# Altium footprint library My Library.PCBLIB: 198 footprints (part 5 of 13)
Each footprint in its own frame and in the unit in brackets; x right, y up, seen from the top. Pads: shape width x height; smd on the part's side, far side on the other; paste and mask are expansions set on the pad; w line width, h text height; cw(c..) or ccw(c..) is an arc to the next point about the centre after c.
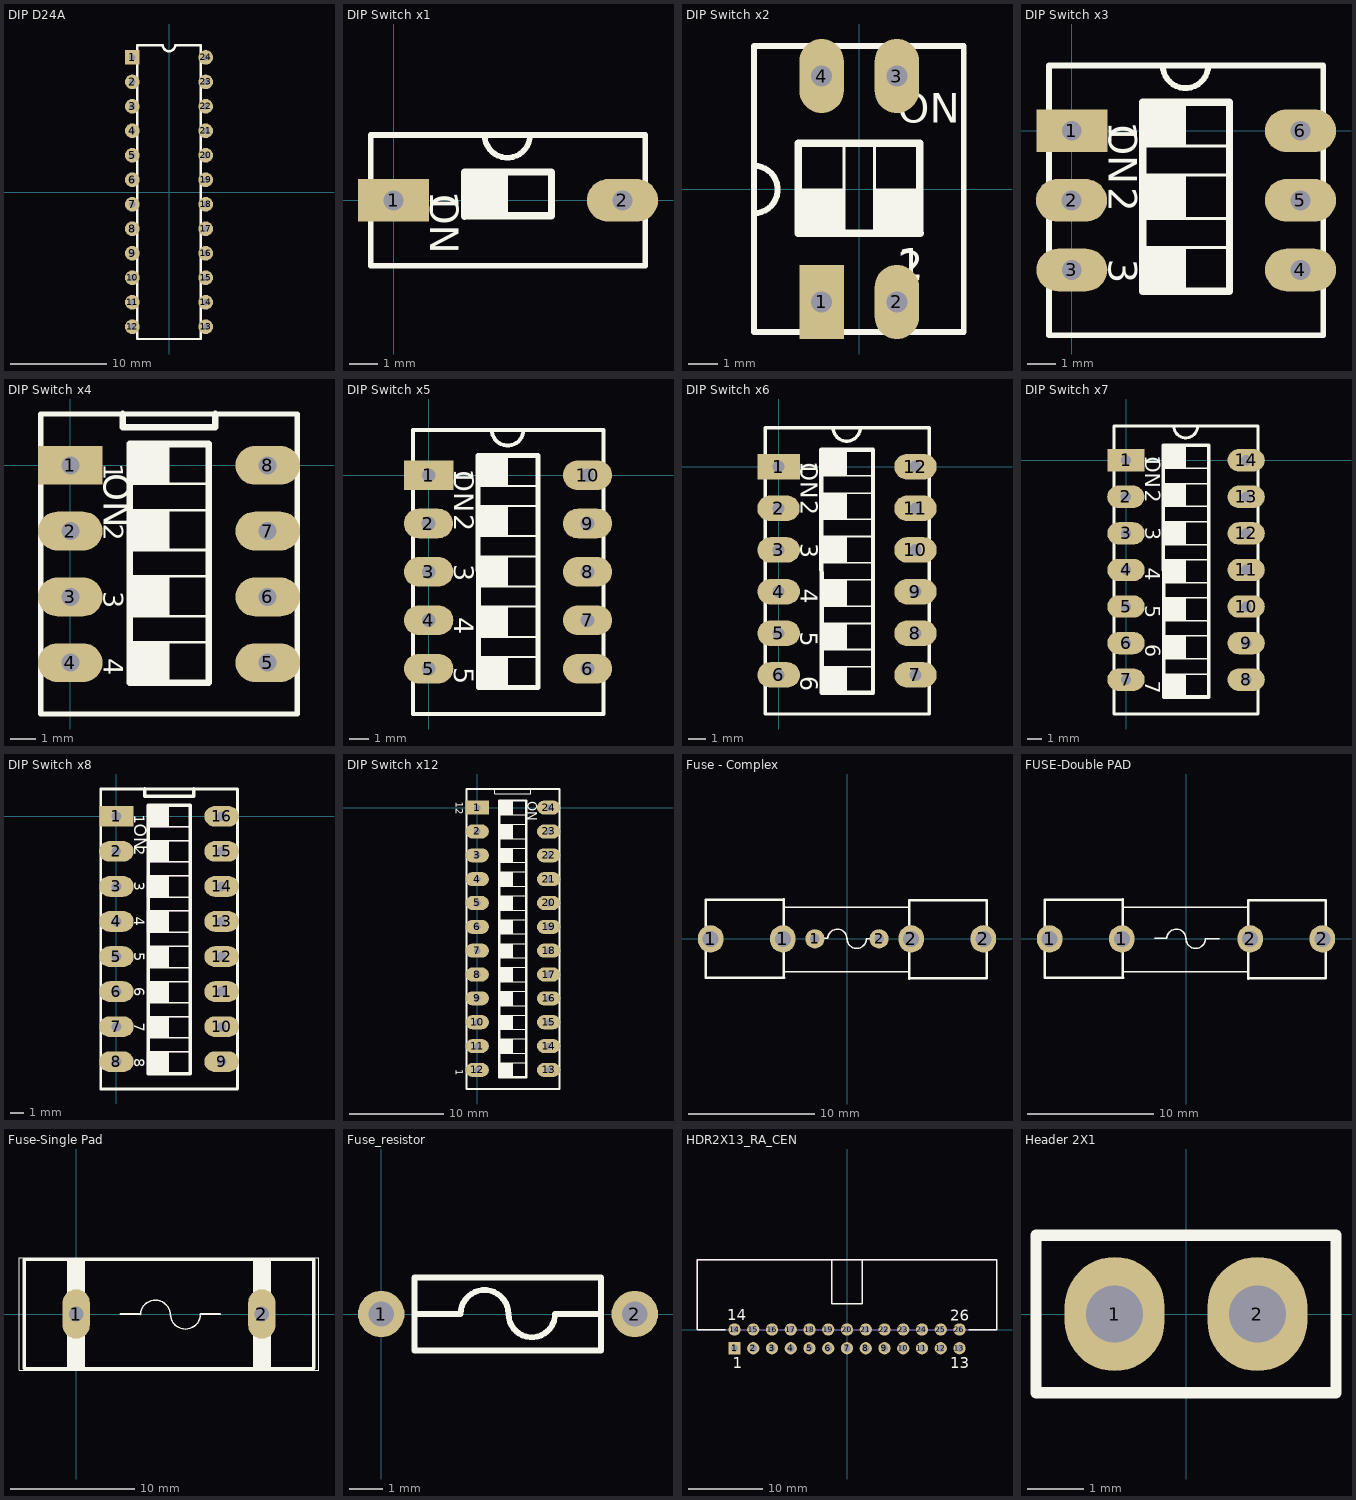
[diagram p4: the footprints below, top view; thin cyan lines are the x and y axes]

## DIP D24A [mil]
pads (24):
  rect 60x60 hole 25: 1(-150,550)
  round 60 hole 25: 2(-150,450) 3(-150,350) 4(-150,250) 5(-150,150) 6(-150,50) 7(-150,-50) 8(-150,-150) 9(-150,-250) 10(-150,-350) 11(-150,-450) 12(-150,-550) 13(150,-550) 14(150,-450) 15(150,-350) 16(150,-250) 17(150,-150) 18(150,-50) 19(150,50) 20(150,150) 21(150,250) 22(150,350) 23(150,450) 24(150,550)
Top Overlay:
  lines w10: -130,-600 130,-600 130,600 25,600 cw(c0,600) -25,600 -130,600 -130,-600
Mechanical 1:
  drawing of 288 lines, arcs and shapes, not listed
3D body: height 75, standoff 65, extent -145,525 -135,575
3D body: height 0, standoff 0, extent -155,525 -155,575
3D body: height 75, standoff 35, extent -155,525 -145,575
3D body: height 35, standoff -75, extent -155,541 -145,559
3D body: height 100, standoff 30, extent -135,-605 135,605
3D body: height 115, standoff 100, extent -135,-605 135,605
3D body: height 35, standoff -75, extent -155,441 -145,459
3D body: height 75, standoff 35, extent -155,425 -145,475
3D body: height 75, standoff 65, extent -145,425 -135,475
3D body: height 35, standoff -75, extent -155,341 -145,359
3D body: height 75, standoff 35, extent -155,325 -145,375
3D body: height 75, standoff 65, extent -145,325 -135,375
3D body: height 35, standoff -75, extent -155,241 -145,259
3D body: height 75, standoff 35, extent -155,225 -145,275
3D body: height 75, standoff 65, extent -145,225 -135,275
3D body: height 35, standoff -75, extent -155,141 -145,159
3D body: height 75, standoff 35, extent -155,125 -145,175
3D body: height 75, standoff 65, extent -145,125 -135,175
3D body: height 35, standoff -75, extent -155,41 -145,59
3D body: height 75, standoff 35, extent -155,25 -145,75
3D body: height 75, standoff 65, extent -145,25 -135,75
3D body: height 35, standoff -75, extent -155,-59 -145,-41
3D body: height 75, standoff 35, extent -155,-75 -145,-25
3D body: height 75, standoff 65, extent -145,-75 -135,-25
3D body: height 35, standoff -75, extent -155,-159 -145,-141
3D body: height 75, standoff 35, extent -155,-175 -145,-125
3D body: height 75, standoff 65, extent -145,-175 -135,-125
3D body: height 35, standoff -75, extent -155,-259 -145,-241
3D body: height 75, standoff 35, extent -155,-275 -145,-225
3D body: height 75, standoff 65, extent -145,-275 -135,-225
3D body: height 35, standoff -75, extent -155,-359 -145,-341
3D body: height 75, standoff 35, extent -155,-375 -145,-325
3D body: height 75, standoff 65, extent -145,-375 -135,-325
3D body: height 35, standoff -75, extent -155,-459 -145,-441
3D body: height 75, standoff 35, extent -155,-475 -145,-425
3D body: height 75, standoff 65, extent -145,-475 -135,-425
3D body: height 35, standoff -75, extent -155,-559 -145,-541
3D body: height 75, standoff 35, extent -155,-575 -145,-525
3D body: height 75, standoff 65, extent -145,-575 -135,-525
3D body: height 35, standoff -75, extent 145,-559 155,-541
3D body: height 75, standoff 35, extent 145,-575 155,-525
3D body: height 75, standoff 65, extent 135,-575 145,-525
3D body: height 35, standoff -75, extent 145,-459 155,-441
3D body: height 75, standoff 35, extent 145,-475 155,-425
3D body: height 75, standoff 65, extent 135,-475 145,-425
3D body: height 35, standoff -75, extent 145,-359 155,-341
3D body: height 75, standoff 35, extent 145,-375 155,-325
3D body: height 75, standoff 65, extent 135,-375 145,-325
3D body: height 35, standoff -75, extent 145,-259 155,-241
3D body: height 75, standoff 35, extent 145,-275 155,-225
3D body: height 75, standoff 65, extent 135,-275 145,-225
3D body: height 35, standoff -75, extent 145,-159 155,-141
3D body: height 75, standoff 35, extent 145,-175 155,-125
3D body: height 75, standoff 65, extent 135,-175 145,-125
3D body: height 35, standoff -75, extent 145,-59 155,-41
3D body: height 75, standoff 35, extent 145,-75 155,-25
3D body: height 75, standoff 65, extent 135,-75 145,-25
3D body: height 35, standoff -75, extent 145,41 155,59
3D body: height 75, standoff 35, extent 145,25 155,75
3D body: height 75, standoff 65, extent 135,25 145,75
3D body: height 35, standoff -75, extent 145,141 155,159
3D body: height 75, standoff 35, extent 145,125 155,175
3D body: height 75, standoff 65, extent 135,125 145,175
3D body: height 35, standoff -75, extent 145,241 155,259
3D body: height 75, standoff 35, extent 145,225 155,275
3D body: height 75, standoff 65, extent 135,225 145,275
3D body: height 35, standoff -75, extent 145,341 155,359
3D body: height 75, standoff 35, extent 145,325 155,375
3D body: height 75, standoff 65, extent 135,325 145,375
3D body: height 35, standoff -75, extent 145,441 155,459
3D body: height 75, standoff 35, extent 145,425 155,475
3D body: height 75, standoff 65, extent 135,425 145,475
3D body: height 35, standoff -75, extent 145,541 155,559
3D body: height 75, standoff 35, extent 145,525 155,575
3D body: height 75, standoff 65, extent 135,525 145,575

## DIP Switch x1 [mm]
height 6.5
pads (2):
  rect 2.5x1.5 hole 0.7: 1(0,0)
  oval 2.5x1.5 hole 0.7: 2(8.05,0)
Top Overlay:
  rectangle: 2.5,-0.556 4.025,1
  lines w0.2: 3.202,2.3 ccw(c4.002,2.3) 4.802,2.3 ; -0.8,-2.3 8.85,-2.3 8.85,2.3 -0.8,2.3 -0.8,-2.3
  lines w0.25: 2.53,-0.54 5.55,-0.54
  lines w0.254: 2.5,-0.556 2.5,1 5.55,1 5.55,-0.54
  text "1" at 1.295,0.33 h1
  text "ON" at 1.295,0.22 h1

## DIP Switch x2 [mm]
height 6.5
pads (4):
  rect 1.5x2.5 hole 0.7: 1(-1.27,-3.81)
  oval 1.5x2.5 hole 0.7: 2(1.27,-3.81) 3(1.27,3.81) 4(-1.27,3.81)
Top Overlay:
  region: 2.056,-1.5 2.056,0.025 0.5,0.025 0.5,-1.5
  region: -0.494,-1.5 -0.494,0.025 -2.05,0.025 -2.05,-1.5
  lines w0.1: -0.51,-1.47 -0.51,1.55 ; 0.51,-1.47 0.51,1.55
  lines w0.2: -3.55,-0.818 ccw(c-3.55,-0.018) -3.55,0.783 ; 3.5,-4.82 -3.55,-4.82 -3.55,4.83 3.5,4.83 ; 3.525,-4.82 3.525,4.83
  lines w0.25: 2.04,-1.47 2.04,1.55
  lines w0.254: 2.04,1.55 -2.05,1.55 -2.05,-1.5 2.056,-1.5
  text "2" at 1.295,-3.08 h1
  text "1" at 1.295,-3 h1
  text "ON" at 1.295,2.23 h1
3D body "dip2.STEP": height 6.91, standoff -1.79, extent -3.25,-5.03 3.25,4.97

## DIP Switch x3 [mm]
height 6.5
pads (6):
  rect 2.5x1.5 hole 0.7: 1(0,0)
  oval 2.5x1.5 hole 0.7: 2(-0.01,-2.45) 3(0,-4.9) 4(8.05,-4.9) 5(8.05,-2.45) 6(8.05,0)
Top Overlay:
  rectangle: 2.5,-0.556 4.025,1
  rectangle: 2.5,-3.106 4.025,-1.55
  rectangle: 2.5,-5.662 4.025,-4.106
  lines w0.1: 2.53,-4.11 5.55,-4.11 ; 2.53,-3.09 5.55,-3.09 ; 2.53,-1.56 5.55,-1.56 ; 2.53,-0.54 5.55,-0.54
  lines w0.2: 3.202,2.3 ccw(c4.002,2.3) 4.802,2.3 ; -0.8,-7.2 -0.8,2.3 8.85,2.3 8.85,-7.2 -0.8,-7.2
  lines w0.25: 2.53,-5.65 5.55,-5.65
  lines w0.254: 2.5,-5.662 2.5,1 5.55,1 5.55,-5.65
  text "ON" at 1.295,0.22 h1
  text "1" at 1.295,0.33 h1
  text "2" at 1.295,-1.98 h1
  text "3" at 1.295,-4.5 h1

## DIP Switch x4 [mm]
height 6.5
pads (8):
  rect 2.5x1.5 hole 0.7: 1(0,0)
  oval 2.5x1.5 hole 0.7: 2(0,-2.54) 3(0,-5.08) 4(0,-7.62) 5(7.62,-7.62) 6(7.62,-5.08) 7(7.62,-2.54) 8(7.62,0)
Top Overlay:
  rectangle: 2.297,-8.394 3.822,-6.838
  rectangle: 2.297,-5.84 3.822,-4.284
  rectangle: 2.297,-3.284 3.822,-1.728
  rectangle: 2.297,-0.734 3.822,0.822
  lines w0.1: 2.327,-6.828 5.347,-6.828 ; 2.327,-5.828 5.347,-5.828 ; 2.327,-4.288 5.347,-4.288 ; 2.327,-3.268 5.347,-3.268 ; 2.327,-1.738 5.347,-1.738 ; 2.327,-0.718 5.347,-0.718
  lines w0.2: -1.143,-9.601 8.763,-9.601 8.763,1.981 -1.143,1.981 -1.143,-9.601
  lines w0.25: 2.297,-8.394 5.347,-8.388
  lines w0.254: 2.032,1.981 2.032,1.473 5.588,1.473 5.588,1.981 ; 2.297,-8.394 2.297,0.822 5.347,0.822 5.347,-8.388
  text "4" at 1.295,-7.444 h0.76
  text "3" at 1.295,-4.853 h0.76
  text "2" at 1.295,-2.261 h0.76
  text "1" at 1.295,0.076 h0.76
  text "ON" at 1.295,-0.313 h1
Mechanical 1:
  circle w0.025: c0,0 r0.254
  circle w0.025: c-0.01,-2.54 r0.254
  circle w0.025: c0,-5.08 r0.254
  circle w0.025: c0,-7.62 r0.254
  circle w0.025: c7.62,-7.62 r0.254
  circle w0.025: c7.62,-5.08 r0.254
  circle w0.025: c7.62,-2.54 r0.254
  circle w0.025: c7.62,0 r0.254
3D body: height 6.35, standoff 0.25, extent 2.362,-0.762 3.073,0.762
3D body: height 0.76, standoff 0, extent 7.367,-0.253 7.873,0.253
3D body: height 0.76, standoff 0, extent 7.367,-2.793 7.873,-2.287
3D body: height 0.76, standoff 0, extent 7.367,-5.333 7.873,-4.827
3D body: height 0.76, standoff 0, extent 7.367,-7.873 7.873,-7.367
3D body: height 0.76, standoff 0, extent -0.253,-0.253 0.253,0.253
3D body: height 0.76, standoff 0, extent -0.263,-2.793 0.243,-2.287
3D body: height 0.76, standoff 0, extent -0.253,-5.333 0.253,-4.827
3D body: height 0.76, standoff 0, extent -0.253,-7.873 0.253,-7.367
3D body: height 3.81, standoff 0, extent 1.9,1.473 5.71,1.981
3D body: height 5.59, standoff 0, extent -1.143,-9.652 8.763,1.981
3D body: height 0.25, standoff 0.05, extent -1.143,-9.652 8.763,1.981
3D body: height 5.08, standoff 0.25, extent 3.073,-0.762 5.253,0.762
3D body: height 5.08, standoff 0.25, extent 3.073,-5.842 5.253,-4.318
3D body: height 6.35, standoff 0.25, extent 2.362,-5.842 3.073,-4.318
3D body: height 5.08, standoff 0.25, extent 3.073,-8.382 5.253,-6.858
3D body: height 6.35, standoff 0.25, extent 2.362,-8.382 3.073,-6.858
3D body: height 5.59, standoff 0, extent 2.362,0.762 5.253,1.473
3D body: height 5.59, standoff 0, extent 2.362,-1.778 5.253,-0.762
3D body: height 5.59, standoff 0, extent 2.362,-6.858 5.253,-5.842
3D body: height 5.59, standoff 0, extent 2.362,-4.318 5.253,-3.302
3D body: height 5.08, standoff 0.25, extent 3.073,-3.302 5.253,-1.778
3D body: height 6.35, standoff 0.25, extent 2.362,-3.302 3.073,-1.778
3D body: height 5.59, standoff 0.25, extent 5.975,-0.597 7.55,1.021
3D body: height 5.59, standoff 0.03, extent 6.06,-0.189 7.478,0.618
3D body: height 5.59, standoff 0.25, extent 5.986,-2.3 7.537,-0.734

## DIP Switch x5 [mm]
height 6.5
pads (10):
  rect 2.5x1.5 hole 0.7: 1(0,0)
  oval 2.5x1.5 hole 0.7: 2(-0.01,-2.45) 3(0,-4.9) 4(0,-7.35) 5(0,-9.8) 6(8.05,-9.8) 7(8.05,-7.35) 8(8.05,-4.9) 9(8.05,-2.45) 10(8.05,0)
Top Overlay:
  rectangle: 2.5,-10.766 4.025,-9.21
  rectangle: 2.5,-8.216 4.025,-6.66
  rectangle: 2.5,-5.662 4.025,-4.106
  rectangle: 2.5,-3.106 4.025,-1.55
  rectangle: 2.5,-0.556 4.025,1
  lines w0.1: 2.53,-9.22 5.55,-9.22 ; 2.53,-8.21 5.55,-8.21 ; 2.53,-6.65 5.55,-6.65 ; 2.53,-5.65 5.55,-5.65 ; 2.53,-4.11 5.55,-4.11 ; 2.53,-3.09 5.55,-3.09 ; 2.53,-1.56 5.55,-1.56 ; 2.53,-0.54 5.55,-0.54
  lines w0.2: 3.202,2.3 ccw(c4.002,2.3) 4.802,2.3 ; -0.8,-12.1 8.85,-12.1 8.85,2.3 -0.8,2.3 -0.8,-12.1
  lines w0.25: 2.53,-10.76 5.55,-10.76
  lines w0.254: 2.53,-10.76 2.5,1 5.55,1 5.55,-10.76
  text "5" at 1.295,-9.72 h1
  text "4" at 1.295,-7.19 h1
  text "3" at 1.295,-4.5 h1
  text "2" at 1.295,-1.98 h1
  text "1" at 1.295,0.33 h1
  text "ON" at 1.295,0.22 h1

## DIP Switch x6 [mm]
height 6.5
pads (12):
  rect 2.5x1.5 hole 0.7: 1(0,0)
  oval 2.5x1.5 hole 0.7: 2(-0.01,-2.45) 3(0,-4.9) 4(0,-7.35) 5(0,-9.8) 6(0,-12.25) 7(8.05,-12.25) 8(8.05,-9.8) 9(8.05,-7.35) 10(8.05,-4.9) 11(8.05,-2.45) 12(8.05,0)
Top Overlay:
  rectangle: 2.5,-0.556 4.025,1
  rectangle: 2.5,-3.106 4.025,-1.55
  rectangle: 2.5,-5.662 4.025,-4.106
  rectangle: 2.5,-8.216 4.025,-6.66
  rectangle: 2.5,-10.766 4.025,-9.21
  rectangle: 2.5,-13.316 4.025,-11.76
  lines w0.1: 2.53,-11.77 5.55,-11.77 ; 2.53,-10.76 5.55,-10.76 ; 2.53,-9.22 5.55,-9.22 ; 2.53,-8.21 5.55,-8.21 ; 2.53,-6.65 5.55,-6.65 ; 2.53,-5.65 5.55,-5.65 ; 2.53,-4.11 5.55,-4.11 ; 2.53,-3.09 5.55,-3.09 ; 2.53,-1.56 5.55,-1.56 ; 2.53,-0.54 5.55,-0.54
  lines w0.2: 3.202,2.3 ccw(c4.002,2.3) 4.802,2.3 ; -0.8,-14.55 -0.8,2.3 8.85,2.3 8.85,-14.55 -0.8,-14.55
  lines w0.25: 2.53,-13.3 5.55,-13.3
  lines w0.254: 2.53,-13.3 2.5,1 5.55,1 5.55,-13.3
  text "ON" at 1.295,0.22 h1
  text "1" at 1.295,0.33 h1
  text "2" at 1.295,-1.98 h1
  text "3" at 1.295,-4.5 h1
  text "4" at 1.295,-7.19 h1
  text "5" at 1.295,-9.72 h1
  text "6" at 1.295,-12.34 h1

## DIP Switch x7 [mm]
height 6.5
pads (14):
  rect 2.5x1.5 hole 0.7: 1(0,0)
  oval 2.5x1.5 hole 0.7: 2(-0.01,-2.45) 3(0,-4.9) 4(0,-7.35) 5(0,-9.8) 6(0,-12.25) 7(0,-14.7) 8(8.05,-14.7) 9(8.05,-12.25) 10(8.05,-9.8) 11(8.05,-7.35) 12(8.05,-4.9) 13(8.05,-2.45) 14(8.05,0)
Top Overlay:
  rectangle: 2.5,-15.876 4.025,-14.32
  rectangle: 2.5,-13.316 4.025,-11.76
  rectangle: 2.5,-10.766 4.025,-9.21
  rectangle: 2.5,-8.216 4.025,-6.66
  rectangle: 2.5,-5.662 4.025,-4.106
  rectangle: 2.5,-3.106 4.025,-1.55
  rectangle: 2.5,-0.556 4.025,1
  lines w0.1: 2.53,-14.33 5.55,-14.33 ; 2.53,-13.3 5.55,-13.3 ; 2.53,-11.77 5.55,-11.77 ; 2.53,-10.76 5.55,-10.76 ; 2.53,-9.22 5.55,-9.22 ; 2.53,-8.21 5.55,-8.21 ; 2.53,-6.65 5.55,-6.65 ; 2.53,-5.65 5.55,-5.65 ; 2.53,-4.11 5.55,-4.11 ; 2.53,-3.09 5.55,-3.09 ; 2.53,-1.56 5.55,-1.56 ; 2.53,-0.54 5.55,-0.54
  lines w0.2: 3.202,2.3 ccw(c4.002,2.3) 4.802,2.3 ; -0.8,-17 8.85,-17 8.85,2.3 -0.8,2.3 -0.8,-17
  lines w0.25: 2.53,-15.86 5.55,-15.86
  lines w0.254: 2.53,-15.86 2.5,1 5.55,1 5.55,-15.86
  text "7" at 1.295,-14.77 h1
  text "6" at 1.295,-12.34 h1
  text "5" at 1.295,-9.72 h1
  text "4" at 1.295,-7.19 h1
  text "3" at 1.295,-4.5 h1
  text "2" at 1.295,-1.98 h1
  text "1" at 1.295,0.33 h1
  text "ON" at 1.295,0.22 h1

## DIP Switch x8 [mm]
height 6.5
pads (16):
  rect 2.5x1.5 hole 0.7: 1(0,0)
  oval 2.5x1.5 hole 0.7: 2(-0.01,-2.54) 3(0,-5.08) 4(0,-7.62) 5(0,-10.16) 6(0,-12.7) 7(0,-15.24) 8(0,-17.78) 9(7.62,-17.78) 10(7.62,-15.24) 11(7.62,-12.7) 12(7.62,-10.16) 13(7.62,-7.62) 14(7.62,-5.08) 15(7.62,-2.54) 16(7.62,0)
Top Overlay:
  rectangle: 2.297,-0.759 3.822,0.797
  rectangle: 2.297,-3.309 3.822,-1.753
  rectangle: 2.297,-5.866 3.822,-4.309
  rectangle: 2.297,-8.419 3.822,-6.863
  rectangle: 2.297,-10.969 3.822,-9.413
  rectangle: 2.297,-13.519 3.822,-11.963
  rectangle: 2.297,-16.079 3.822,-14.523
  rectangle: 2.297,-18.629 3.822,-17.073
  lines w0.1: 2.327,-17.073 5.347,-17.073 ; 2.327,-16.063 5.347,-16.063 ; 2.327,-14.533 5.347,-14.533 ; 2.327,-13.503 5.347,-13.503 ; 2.327,-11.973 5.347,-11.973 ; 2.327,-10.963 5.347,-10.963 ; 2.327,-9.423 5.347,-9.423 ; 2.327,-8.413 5.347,-8.413 ; 2.327,-6.853 5.347,-6.853 ; 2.327,-5.853 5.347,-5.853 ; 2.327,-4.313 5.347,-4.313 ; 2.327,-3.293 5.347,-3.293 ; 2.327,-1.763 5.347,-1.763 ; 2.327,-0.743 5.347,-0.743
  lines w0.2: -1.143,-19.761 8.763,-19.761 8.763,1.981 -1.143,1.981 -1.143,-19.761
  lines w0.254: 2.032,1.981 2.032,1.473 5.588,1.473 5.588,1.981 ; 2.297,-18.653 2.297,0.797 5.347,0.797 5.347,-18.653 2.297,-18.653
  text "ON" at 1.295,-0.542 h0.89
  text "1" at 1.295,0.101 h0.76
  text "2" at 1.295,-2.163 h0.76
  text "3" at 1.295,-4.723 h0.76
  text "4" at 1.295,-7.284 h0.76
  text "5" at 1.295,-9.844 h0.76
  text "6" at 1.295,-12.405 h0.76
  text "7" at 1.295,-14.965 h0.76
  text "8" at 1.295,-17.526 h0.76
Mechanical 1:
  circle w0.025: c0,0 r0.254
  circle w0.025: c7.62,0 r0.254
  circle w0.025: c7.62,-2.54 r0.254
  circle w0.025: c-0.01,-2.54 r0.254
  circle w0.025: c0,-5.08 r0.254
  circle w0.025: c7.62,-5.08 r0.254
  circle w0.025: c7.62,-7.62 r0.254
  circle w0.025: c0,-7.62 r0.254
  circle w0.025: c0,-10.16 r0.254
  circle w0.025: c7.62,-10.16 r0.254
  circle w0.025: c7.62,-12.7 r0.254
  circle w0.025: c0,-12.7 r0.254
  circle w0.025: c0,-15.24 r0.254
  circle w0.025: c7.62,-15.24 r0.254
  circle w0.025: c7.62,-17.78 r0.254
  circle w0.025: c0,-17.78 r0.254
  lines w0.025: 5.309,-11.938 5.309,-13.487 2.261,-13.487 2.261,-11.938 5.359,-11.938 ; 5.309,-6.833 5.309,-8.407 2.235,-8.407 2.235,-6.833 5.359,-6.833 ; 5.334,-17.069 5.334,-18.694 2.235,-18.694 2.235,-17.069 5.359,-17.069 ; 5.334,-14.529 2.261,-14.529 2.261,-16.027 5.359,-16.027 5.359,-14.529 ; 5.334,-4.318 5.334,-5.867 2.235,-5.867 2.235,-4.318 5.359,-4.318 ; 5.334,-0.762 5.41,-0.762 5.41,0.813 2.235,0.813 2.235,-0.762 5.359,-0.762 ; 5.359,-9.423 5.359,-10.947 2.261,-10.947 2.261,-9.423 5.385,-9.423 ; -1.143,-19.761 8.763,-19.761 8.763,1.981 -1.143,1.981 -1.143,-19.761 ; 2.032,1.473 5.588,1.473 5.588,1.981 2.032,1.981 2.032,1.473 ; 2.261,-3.302 5.334,-3.302 5.334,-1.778 2.261,-1.778 2.261,-3.302
3D body: height 5.59, standoff 0, extent 2.235,-19.761 5.41,-18.693
3D body: height 5.59, standoff 0, extent 2.236,-17.069 5.411,-16.154
3D body: height 5.59, standoff 0, extent 2.261,-14.529 5.436,-13.487
3D body: height 5.59, standoff 0, extent 2.262,-11.938 5.437,-11.048
3D body: height 5.59, standoff 0, extent 2.236,-9.423 5.411,-8.407
3D body: height 5.59, standoff 0, extent 2.236,-6.832 5.411,-5.866
3D body: height 5.59, standoff 0, extent 2.236,-4.318 5.411,-3.403
3D body: height 5.59, standoff 0, extent 2.235,-1.778 5.41,-0.762
3D body: height 5.59, standoff 0, extent 2.235,0.813 5.41,1.473
3D body: height 5.59, standoff 0, extent 5.41,-19.761 8.763,1.981
3D body: height 5.59, standoff 0, extent -1.143,-19.761 2.236,1.981
3D body: height 3.81, standoff 0, extent 2.032,1.473 5.613,1.981
3D body: height 0.76, standoff 0, extent 7.367,-2.793 7.873,-2.287
3D body: height 0.76, standoff 0, extent 7.367,-5.333 7.873,-4.827
3D body: height 0.76, standoff 0, extent 7.367,-7.873 7.873,-7.367
3D body: height 0.76, standoff 0, extent 7.367,-0.253 7.873,0.253
3D body: height 0.76, standoff 0, extent 7.367,-18.033 7.873,-17.527
3D body: height 0.76, standoff 0, extent 7.367,-12.953 7.873,-12.447
3D body: height 0.76, standoff 0, extent 7.367,-15.493 7.873,-14.987
3D body: height 5.08, standoff 0, extent 2.236,-5.866 5.334,-4.318
3D body: height 0.76, standoff 0, extent -0.253,-0.253 0.253,0.253
3D body: height 0.76, standoff 0, extent -0.263,-2.793 0.243,-2.287
3D body: height 0.76, standoff 0, extent -0.253,-5.333 0.253,-4.827
3D body: height 0.76, standoff 0, extent -0.253,-7.873 0.253,-7.367
3D body: height 5.08, standoff 0, extent 2.339,-8.405 5.411,-6.832
3D body: height 5.08, standoff 0, extent 2.26,-16.028 5.36,-14.528
3D body: height 5.08, standoff 0, extent 2.313,-18.693 5.411,-17.069
3D body: height 0.76, standoff 0, extent -0.253,-10.413 0.253,-9.907
3D body: height 0.76, standoff 0, extent -0.253,-12.953 0.253,-12.447
3D body: height 0.76, standoff 0, extent -0.253,-15.493 0.253,-14.987
3D body: height 0.76, standoff 0, extent -0.253,-18.033 0.253,-17.527
3D body: height 5.08, standoff 0, extent 2.338,-16.153 5.436,-14.529
3D body: height 5.08, standoff 0, extent 2.339,-13.563 5.437,-11.938
3D body: height 5.08, standoff 0, extent 2.262,-11.048 5.359,-9.423
3D body: height 5.08, standoff 0, extent 2.312,-3.403 5.41,-1.778
3D body: height 5.08, standoff 0, extent 2.312,-0.812 5.41,0.813
3D body: height 6.35, standoff 0, extent 2.235,-0.812 3.759,0.813
3D body: height 6.35, standoff 0, extent 2.261,-3.403 3.785,-1.778
3D body: height 6.35, standoff 0, extent 2.236,-5.943 3.76,-4.318
3D body: height 6.35, standoff 0, extent 2.236,-8.457 3.76,-6.833
3D body: height 6.35, standoff 0, extent 2.262,-11.048 3.786,-9.423
3D body: height 6.35, standoff 0, extent 2.261,-13.563 3.785,-11.938
3D body: height 6.35, standoff 0, extent 2.236,-16.154 3.76,-14.529
3D body: height 6.35, standoff 0, extent 2.235,-18.693 3.759,-17.069

## DIP Switch x12 [mm]
pads (24):
  rect 2.5x1.5 hole 0.7: 1(0,0)
  oval 2.5x1.5 hole 0.7: 2(0,-2.54) 3(0,-5.08) 4(0,-7.62) 5(0,-10.16) 6(0,-12.7) 7(0,-15.24) 8(0,-17.78) 9(0,-20.32) 10(0,-22.86) 11(0,-25.4) 12(0,-27.94) 13(7.62,-27.94) 14(7.62,-25.4) 15(7.62,-22.86) 16(7.62,-20.32) 17(7.62,-17.78) 18(7.62,-15.24) 19(7.62,-12.7) 20(7.62,-10.16) 21(7.62,-7.62) 22(7.62,-5.08) 23(7.62,-2.54) 24(7.62,0)
Top Overlay:
  region: 3.808,0.762 2.362,0.762 2.362,-0.762 3.808,-0.762
  region: 3.808,-1.778 2.362,-1.778 2.362,-3.302 3.808,-3.302
  region: 3.808,-4.318 2.362,-4.318 2.362,-5.842 3.808,-5.842
  region: 3.808,-6.858 2.362,-6.858 2.362,-8.382 3.808,-8.382
  region: 3.808,-9.398 2.362,-9.398 2.362,-10.922 3.808,-10.922
  region: 3.808,-11.938 2.362,-11.938 2.362,-13.462 3.808,-13.462
  region: 3.808,-14.478 2.362,-14.478 2.362,-16.002 3.808,-16.002
  region: 3.808,-17.018 2.362,-17.018 2.362,-18.542 3.808,-18.542
  region: 3.808,-19.558 2.362,-19.558 2.362,-21.082 3.808,-21.082
  region: 3.808,-22.098 2.362,-22.098 2.362,-23.622 3.808,-23.622
  region: 3.808,-24.638 2.362,-24.638 2.362,-26.162 3.808,-26.162
  region: 3.808,-27.178 2.362,-27.178 2.362,-28.702 3.808,-28.702
  lines w0.1: 2.362,-28.702 5.253,-28.702 ; 2.362,-27.178 5.253,-27.178 ; 2.362,-26.162 5.253,-26.162 ; 2.362,-24.638 5.253,-24.638 ; 2.362,-23.622 5.253,-23.622 ; 2.362,-22.098 5.253,-22.098 ; 2.362,-21.082 5.253,-21.082 ; 2.362,-19.558 5.253,-19.558 ; 2.362,-18.542 5.253,-18.542 ; 2.362,-17.018 5.253,-17.018 ; 2.362,-16.002 5.253,-16.002 ; 2.362,-14.478 5.253,-14.478 ; 2.362,-13.462 5.253,-13.462 ; 2.362,-11.938 5.253,-11.938 ; 2.362,-10.922 5.253,-10.922 ; 2.362,-9.398 5.253,-9.398 ; 2.362,-8.382 5.253,-8.382 ; 2.362,-6.858 5.253,-6.858 ; 2.362,-5.842 5.253,-5.842 ; 2.362,-4.318 5.253,-4.318 ; 2.362,-3.302 5.253,-3.302 ; 2.362,-1.778 5.253,-1.778 ; 2.362,-0.762 5.253,-0.762
  lines w0.127: 1.9,1.981 1.9,1.473 5.71,1.473 5.71,1.981
  lines w0.2: -1.143,-29.972 -1.143,1.981 8.763,1.981 8.763,-29.972 -1.143,-29.972
  lines w0.254: 2.362,-28.702 5.253,-28.702 5.253,0.762 2.362,0.762 2.362,-28.702
  text "ON" at 5.399,0.673 h1
  text "12" at -2.286,0.61 h0.76
  text "1" at -2.286,-27.864 h0.76
Mechanical 1:
  circle w0.025: c0,-17.78 r0.254
  circle w0.025: c7.62,-17.78 r0.254
  circle w0.025: c0,-15.24 r0.254
  circle w0.025: c0,-12.7 r0.254
  circle w0.025: c7.62,-12.7 r0.254
  circle w0.025: c7.62,-10.16 r0.254
  circle w0.025: c0,-10.16 r0.254
  circle w0.025: c0,0 r0.254
  circle w0.025: c-0.01,-2.54 r0.254
  circle w0.025: c0,-5.08 r0.254
  circle w0.025: c0,-7.62 r0.254
  circle w0.025: c7.62,-7.62 r0.254
  circle w0.025: c7.62,-5.08 r0.254
  circle w0.025: c7.62,-2.54 r0.254
  circle w0.025: c7.62,0 r0.254
3D body: height 0.76, standoff 0, extent 7.367,-20.573 7.873,-20.067
3D body: height 0.76, standoff 0, extent 7.367,-23.113 7.873,-22.607
3D body: height 0.76, standoff 0, extent 7.367,-25.653 7.873,-25.147
3D body: height 0.76, standoff 0, extent 7.367,-28.193 7.873,-27.687
3D body: height 0.76, standoff 0, extent -0.253,-28.193 0.253,-27.687
3D body: height 0.76, standoff 0, extent -0.253,-25.653 0.253,-25.147
3D body: height 0.76, standoff 0, extent -0.253,-23.113 0.253,-22.607
3D body: height 0.76, standoff 0, extent -0.253,-20.573 0.253,-20.067
3D body: height 0.76, standoff 0, extent -0.253,-18.033 0.253,-17.527
3D body: height 0.76, standoff 0, extent -0.253,-15.493 0.253,-14.987
3D body: height 0.76, standoff 0, extent -0.253,-12.953 0.253,-12.447
3D body: height 0.76, standoff 0, extent -0.253,-10.413 0.253,-9.907
3D body: height 0.76, standoff 0, extent 7.367,-12.953 7.873,-12.447
3D body: height 0.76, standoff 0, extent 7.367,-18.033 7.873,-17.527
3D body: height 0.76, standoff 0, extent 7.367,-15.493 7.873,-14.987
3D body: height 6.35, standoff 0.25, extent 2.362,-0.762 3.073,0.762
3D body: height 0.76, standoff 0, extent 7.367,-0.253 7.873,0.253
3D body: height 0.76, standoff 0, extent 7.367,-2.793 7.873,-2.287
3D body: height 0.76, standoff 0, extent 7.367,-5.333 7.873,-4.827
3D body: height 0.76, standoff 0, extent 7.367,-7.873 7.873,-7.367
3D body: height 0.76, standoff 0, extent -0.253,-0.253 0.253,0.253
3D body: height 0.76, standoff 0, extent -0.263,-2.793 0.243,-2.287
3D body: height 0.76, standoff 0, extent -0.253,-5.333 0.253,-4.827
3D body: height 0.76, standoff 0, extent -0.253,-7.873 0.253,-7.367
3D body: height 3.81, standoff 0, extent 1.9,1.473 5.71,1.981
3D body: height 5.59, standoff 0, extent -1.143,-29.972 8.763,1.981
3D body: height 0.25, standoff 0.05, extent -1.143,-29.972 8.763,1.981
3D body: height 5.08, standoff 0.25, extent 3.073,-0.762 5.253,0.762
3D body: height 5.08, standoff 0.25, extent 3.073,-5.842 5.253,-4.318
3D body: height 6.35, standoff 0.25, extent 2.362,-5.842 3.073,-4.318
3D body: height 5.08, standoff 0.25, extent 3.073,-8.382 5.253,-6.858
3D body: height 6.35, standoff 0.25, extent 2.362,-8.382 3.073,-6.858
3D body: height 5.59, standoff 0, extent 2.362,0.762 5.253,1.473
3D body: height 5.59, standoff 0, extent 2.362,-1.778 5.253,-0.762
3D body: height 5.59, standoff 0, extent 2.362,-6.858 5.253,-5.842
3D body: height 5.59, standoff 0, extent 2.362,-4.318 5.253,-3.302
3D body: height 5.08, standoff 0.25, extent 3.073,-3.302 5.253,-1.778
3D body: height 6.35, standoff 0.25, extent 2.362,-3.302 3.073,-1.778
3D body: height 6.35, standoff 0.25, extent 2.362,-10.922 3.073,-9.398
3D body: height 5.08, standoff 0.25, extent 3.073,-10.922 5.253,-9.398
3D body: height 5.59, standoff 0, extent 2.362,-9.398 5.253,-8.382
3D body: height 6.35, standoff 0.25, extent 2.362,-13.462 3.073,-11.938
3D body: height 5.08, standoff 0.25, extent 3.073,-13.462 5.253,-11.938
3D body: height 5.59, standoff 0, extent 2.362,-11.938 5.253,-10.922
3D body: height 6.35, standoff 0.25, extent 2.362,-16.002 3.073,-14.478
3D body: height 5.08, standoff 0.25, extent 3.073,-16.002 5.253,-14.478
3D body: height 5.59, standoff 0, extent 2.362,-14.478 5.253,-13.462
3D body: height 6.35, standoff 0.25, extent 2.362,-18.542 3.073,-17.018
3D body: height 5.08, standoff 0.25, extent 3.073,-18.542 5.253,-17.018
3D body: height 5.59, standoff 0, extent 2.362,-17.018 5.253,-16.002
3D body: height 6.35, standoff 0.25, extent 2.362,-21.082 3.073,-19.558
3D body: height 5.08, standoff 0.25, extent 3.073,-21.082 5.253,-19.558
3D body: height 5.59, standoff 0, extent 2.362,-19.558 5.253,-18.542
3D body: height 6.35, standoff 0.25, extent 2.362,-23.622 3.073,-22.098
3D body: height 5.08, standoff 0.25, extent 3.073,-23.622 5.253,-22.098
3D body: height 5.59, standoff 0, extent 2.362,-22.098 5.253,-21.082
3D body: height 6.35, standoff 0.25, extent 2.362,-26.162 3.073,-24.638
3D body: height 5.08, standoff 0.25, extent 3.073,-26.162 5.253,-24.638
3D body: height 5.59, standoff 0, extent 2.362,-24.638 5.253,-23.622
3D body: height 6.35, standoff 0.25, extent 2.362,-28.702 3.073,-27.178
3D body: height 5.08, standoff 0.25, extent 3.073,-28.702 5.253,-27.178
3D body: height 5.59, standoff 0, extent 2.362,-27.178 5.253,-26.162
3D body: height 5.59, standoff 0.25, extent 6.005,-0.662 7.579,0.956
3D body: height 5.59, standoff 0.03, extent 6.09,-0.254 7.507,0.554
3D body: height 5.59, standoff 0.25, extent 6.015,-2.365 7.567,-0.799

## Fuse - Complex [mil]
pads (6):
  oval 80x85 hole 50: 1(-425,0) 1(-200,0) 2(200,0) 2(425,0)
  round 60 hole 30: 1(-100,0) 2(100,0)
Top Overlay:
  lines w3.94: -197.37,99.1 194.69,99.1 ; -197.05,-102 194.69,-102
  lines w5: -97.77,1.22 -59.98,1.22 ; -59.97,1.22 cw(c-30,0) 0,0 ccw(c30,0) 60,0 104.09,0
  lines w7.87: -197.44,122.64 -197.05,0.2 -197.05,-121.06 ; -197.05,122.24 -440,122.24 -440,-121.46 -195.87,-121.46 ; 193.9,-123.43 435,-123.43 435,120.28 198.23,120.28 ; 194.69,-123.82 194.69,119.88
3D body "Fuse Leg_2009.STEP": height 377.88, standoff -129.94, extent 196,-119 436,124.71
3D body "Fuse Small 1A.STEP": height 350.39, standoff 149.61, extent -392,-101 383.59,99.79
3D body "Fuse Leg_2009.STEP": height 377.88, standoff -129.94, extent -434,-121.46 -194,122.25

## FUSE-Double PAD [mil]
pads (4):
  oval 80x85 hole 50: 1(-425,0) 1(-200,0) 2(200,0) 2(425,0)
Top Overlay:
  lines w3.94: -197.37,99.1 194.69,99.1 ; -197.05,-102 194.69,-102
  lines w5: -97.77,1.22 -59.98,1.22 ; -59.97,1.22 cw(c-30,0) 0,0 ccw(c30,0) 60,0 104.09,0
  lines w7.87: -197.44,122.64 -197.05,0.2 -197.05,-121.06 ; -197.05,122.24 -440,122.24 -440,-121.46 -195.87,-121.46 ; 193.9,-123.43 435,-123.43 435,120.28 198.23,120.28 ; 194.69,-123.82 194.69,119.88
3D body "Fuse Leg_2009.STEP": height 377.88, standoff -129.94, extent 196,-119 436,124.71
3D body "Fuse Small 1A.STEP": height 350.39, standoff 149.61, extent -392,-101 383.59,99.79
3D body "Fuse Leg_2009.STEP": height 377.88, standoff -129.94, extent -434,-121.46 -194,122.25

## Fuse-Single Pad [mm]
height 14
pads (2):
  oval 2.2x4 hole 1.2: 1(0,0) 2(15,0)
Top Overlay:
  rectangle: -0.74,-4.4 0.71,4.4
  rectangle: 14.29,-4.4 15.74,4.4
  lines w0.08: -4.62,-4.56 19.62,-4.56 19.62,4.56 -4.62,4.56 -4.62,-4.56
  lines w0.127: 5.178,-0.05 cw(c6.393,-0.1) 7.61,-0.1 ; 7.61,0 ccw(c8.827,0) 10.043,0
  lines w0.2: 3.6,0 5.17,0 ; 10.07,0 11.6,0
  lines w0.254: -4.2,-4.4 19.2,-4.4 19.2,4.4 -4.2,4.4 -4.2,-4.4

## Fuse_resistor [mil]
pads (2):
  round 55 hole 30: 1(0,0) 2(300,0)
Top Overlay:
  lines w7: 39.37,0 93.81,0 cw(c122.2,0) 150.59,0 ccw(c178.15,0) 205.71,0 259.84,0
  lines w7.09: 39.37,-43.31 259.84,-43.31 259.84,43.31 39.37,43.31 39.37,-43.31

## HDR2X13_RA_CEN [mm]
height 9.2
pads (26):
  rect 1.65x1.65 hole 1: 1(-15.24,-2.54)
  round 1.65 hole 1: 2(-12.7,-2.54) 3(-10.16,-2.54) 4(-7.62,-2.54) 5(-5.08,-2.54) 6(-2.54,-2.54) 7(0,-2.54) 8(2.54,-2.54) 9(5.08,-2.54) 10(7.62,-2.54) 11(10.16,-2.54) 12(12.7,-2.54) 13(15.24,-2.54) 14(-15.24,0) 15(-12.7,0) 16(-10.16,0) 17(-7.62,0) 18(-5.08,0) 19(-2.54,0) 20(0,0) 21(2.54,0) 22(5.08,0) 23(7.62,0) 24(10.16,0) 25(12.7,0) 26(15.24,0)
Top Overlay:
  lines w0.2: -16.465,0 -20.32,0 -20.32,9.45 20.32,9.45 20.32,0 16.465,0 ; -2.05,9.45 -2.05,3.48 2.05,3.48 2.05,9.45
  text "13" at 13.99,-5.24 h1.5
  text "26" at 13.99,1.2 h1.5
  text "1" at -15.49,-5.24 h1.5
  text "14" at -16.256,1.27 h1.5
Mechanical 13:
  lines w0.1: -20.32,0 20.32,0 20.32,9.45 -20.32,9.45 -20.32,0
3D body: height 9.2, standoff 0, extent -20.32,0 20.32,9.45

## Header 2X1 [mil]
pads (2):
  oval 70x80 hole 40: 1(-50,0) 2(50,0)
Top Overlay:
  lines w7.87: -105.12,-55.12 -105.12,55.12 105.12,55.12 105.12,-55.12 -105.12,-55.12